# Altium footprint library SMT.PcbLib: 325 footprints (part 18 of 21)
Each footprint in its own frame and in the unit in brackets; x right, y up, seen from the top. Pads: shape width x height; smd on the part's side, far side on the other; paste and mask are expansions set on the pad; w line width, h text height; cw(c..) or ccw(c..) is an arc to the next point about the centre after c.
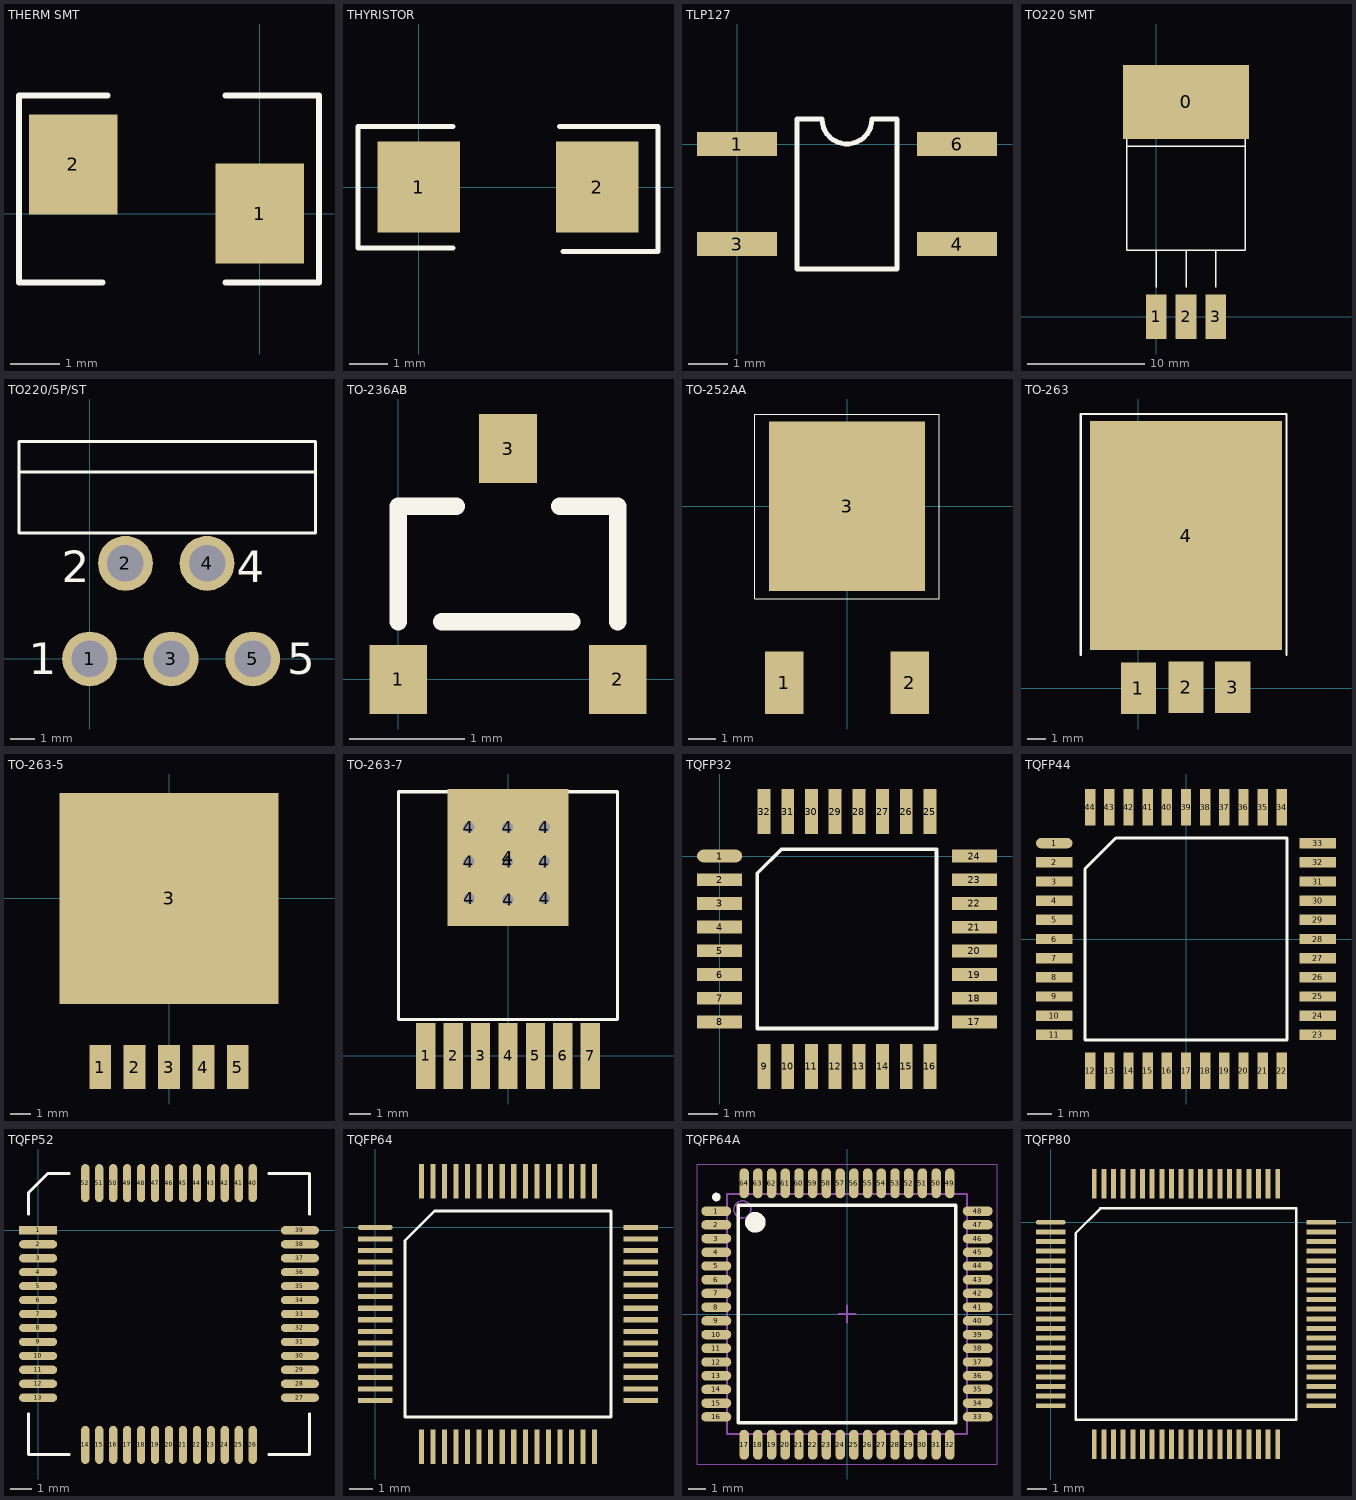
[diagram p17: the footprints below, top view; thin cyan lines are the x and y axes]

## THERM SMT [mm]
pads (2):
  rect 1.8x2.032 smd: 1(0,0) 2(-3.8,1)
TopOverlay:
  lines w0.127: -3.2,-1.4 -4.9,-1.4 -4.9,2.4 -3.1,2.4 ; -0.7,-1.4 1.2,-1.4 1.2,2.4 -0.7,2.4

## THYRISTOR [mm]
pads (2):
  rect 2.16x2.4 smd: 1(0,0) 2(4.7,0)
TopOverlay:
  lines w0.127: 0.9,-1.6 -1.6,-1.6 -1.6,1.6 0.9,1.6 ; 3.7,1.6 6.3,1.6 6.3,-1.7 3.8,-1.7

## TLP127 [mil]
pads (4):
  rect 80x24 smd: 1(0,0) 3(0,-100) 4(220,-100) 6(220,0)
TopOverlay:
  lines w5: 60,-125 60,25 85,25 ccw(c110,25) 135,25 160,25 160,-125 60,-125

## TO220 SMT [mil]
pads (4):
  rect 425x250 smd: 0(100,725)
  rect 70x150 smd: 1(0,0) 2(100,0) 3(200,0)
TopOverlay:
  lines w5: -100,575 300,575 ; 0,100 0,225 ; 100,100 100,225 ; 200,100 200,225 ; -100,225 -100,825 300,825 300,225 -100,225

## TO220/5P/ST [mil]
pads (5):
  round 90 hole 60: 1(0,0) 2(59,157) 3(134,0) 4(193,157) 5(268,0)
TopOverlay:
  lines w5: -116,307 371,307 ; -116,207 -116,357 371,357 371,207 -116,207
  text "2" at -46,126 h52
  text "4" at 242,126 h52
  text "5" at 325,-25 h52
  text "1" at -100,-25 h52

## TO-236AB [mm]
height 1.1
pads (3):
  rect 0.5x0.6 smd: 1(0,0) 2(1.9,0) 3(0.95,2)
TopOverlay:
  lines w0.152: 0,0.5 0,1.5 0.5,1.5 ; 0.375,0.5 1.5,0.5 ; 1.4,1.5 1.9,1.5 1.9,0.5

## TO-252AA [mil] "DPAK (TO-252)"
height 2.38
pads (3):
  rect 55x90 smd: 1(-90,-253.35) 2(90,-253.35)
  rect 224.02x243.31 smd: 3(0,0)
TopOverlay:
  lines w1: -132.48,-132.48 -132.48,132.48 132.48,132.48 132.48,-132.48 -132.48,-132.48
3D body: height 22.83, standoff 0, extent 76.65,-280.51 106.18,-191.93
3D body: height 47.24, standoff 0, extent 76.65,-191.93 106.18,-177.17
3D body: height 47.24, standoff 22.83, extent 76.65,-191.93 106.18,-122.05
3D body: height 22.83, standoff 0, extent -118.11,86.61 118.11,132.87
3D body: height 47.24, standoff 22.83, extent -103.35,-191.93 -73.82,-122.05
3D body: height 47.24, standoff 0, extent -103.35,-191.93 -73.82,-177.17
3D body: height 22.83, standoff 0, extent -103.35,-280.51 -73.82,-191.93
3D body: height 94.09, standoff 0, extent -131.89,-122.05 131.89,86.61

## TO-263 [mil]
pads (4):
  rect 75x110 smd: 1(0,0) 2(101.69,1.89) 3(201.69,1.89)
  rect 410x490 smd: 4(101.69,326.89)
TopOverlay:
  lines w5: -123.31,71.89 -123.31,586.89 316.69,586.89 316.69,71.89

## TO-263-5 [mm] "5-LEAD TP-263 PACKAGE"
height 4.65
pads (6):
  rect 1.07x2.16 smd: 1(-3.4,-8.325) 2(-1.7,-8.325) 3(0,-8.325) 4(1.7,-8.325) 5(3.4,-8.325)
  rect 10.8x10.41 smd: 3(0,0)

## TO-263-7 [mm]
height 0.051
pads (17):
  rect 0.89x3.06 smd: 1(-3.81,0) 2(-2.54,0) 3(-1.27,0) 4(0,0) 5(1.27,0) 6(2.54,0) 7(3.81,0)
  round 1 hole 0.5: 4(-1.813,9.01) 4(-1.813,10.6) 4(-1.8,7.305) 4(-0.012,9.01) 4(-0.012,10.6) 4(0,7.25) 4(1.687,9.01) 4(1.687,10.6) 4(1.7,7.305)
  rect 5.59x6.35 smd: 4(0,9.2)
TopOverlay:
  lines w0.152: -5.08,1.695 -5.08,12.245 5.08,12.245 5.08,1.695 -5.08,1.695
3D body: height 2, standoff 0, extent -5.08,1.7 5.08,12.25
3D body: height 0.2, standoff 0, extent -4.135,-0.625 -3.485,0.625
3D body: height 0.8, standoff 0, extent -4.135,0.625 -3.485,0.875
3D body: height 0.8, standoff 0.6, extent -4.135,0.875 -3.485,1.7
3D body: height 0.8, standoff 0.6, extent -2.865,0.875 -2.215,1.7
3D body: height 0.8, standoff 0, extent -2.865,0.625 -2.215,0.875
3D body: height 0.2, standoff 0, extent -2.865,-0.625 -2.215,0.625
3D body: height 0.8, standoff 0.6, extent -1.595,0.875 -0.945,1.7
3D body: height 0.8, standoff 0, extent -1.595,0.625 -0.945,0.875
3D body: height 0.2, standoff 0, extent -1.595,-0.625 -0.945,0.625
3D body: height 0.8, standoff 0.6, extent -0.325,0.875 0.325,1.7
3D body: height 0.8, standoff 0, extent -0.325,0.625 0.325,0.875
3D body: height 0.2, standoff 0, extent -0.325,-0.625 0.325,0.625
3D body: height 0.8, standoff 0.6, extent 0.945,0.875 1.595,1.7
3D body: height 0.8, standoff 0, extent 0.945,0.625 1.595,0.875
3D body: height 0.2, standoff 0, extent 0.945,-0.625 1.595,0.625
3D body: height 0.8, standoff 0.6, extent 2.215,0.875 2.865,1.7
3D body: height 0.8, standoff 0, extent 2.215,0.625 2.865,0.875
3D body: height 0.2, standoff 0, extent 2.215,-0.625 2.865,0.625
3D body: height 0.8, standoff 0.6, extent 3.485,0.875 4.135,1.7
3D body: height 0.8, standoff 0, extent 3.485,0.625 4.135,0.875
3D body: height 0.2, standoff 0, extent 3.485,-0.625 4.135,0.625

## TQFP32 [mil]
pads (32):
  oval 60x17 smd: 1(0,0)
  rect 60x17 smd: 2(0,-31.5) 3(0,-62.99) 4(0,-94.49) 5(0,-125.98) 6(0,-157.48) 7(0,-188.98) 8(0,-220.47) 17(338.58,-220.54) 18(338.58,-189.04) 19(338.58,-157.54) 20(338.58,-126.05) 21(338.58,-94.55) 22(338.58,-63.05) 23(338.58,-31.56) 24(338.58,-0.06)
  rect 17x60 smd: 9(59.05,-279.53) 10(90.55,-279.53) 11(122.05,-279.53) 12(153.54,-279.53) 13(185.04,-279.53) 14(216.54,-279.53) 15(248.03,-279.53) 16(279.53,-279.53) 25(279.53,58.99) 26(248.03,58.99) 27(216.54,58.99) 28(185.04,58.99) 29(153.54,58.99) 30(122.05,58.99) 31(90.55,58.99) 32(59.05,58.99)
TopOverlay:
  lines w5: 50.07,-229.01 288.07,-229.01 288.07,8.99 82.07,8.99 50.07,-23.01 50.07,-229.01

## TQFP44 [mil]
pads (44):
  oval 60x17 smd: 1(-216.54,157.48)
  rect 60x17 smd: 2(-216.54,125.98) 3(-216.54,94.49) 4(-216.54,62.99) 5(-216.54,31.5) 6(-216.54,0) 7(-216.54,-31.5) 8(-216.54,-62.99) 9(-216.54,-94.49) 10(-216.54,-125.98) 11(-216.54,-157.48) 23(216.54,-157.48) 24(216.54,-125.98) 25(216.54,-94.49) 26(216.54,-62.99) 27(216.54,-31.5) 28(216.54,0) 29(216.54,31.5) 30(216.54,62.99) 31(216.54,94.49) 32(216.54,125.98) 33(216.54,157.48)
  rect 17x60 smd: 12(-157.48,-216.54) 13(-125.98,-216.54) 14(-94.49,-216.54) 15(-62.99,-216.54) 16(-31.5,-216.54) 17(0,-216.54) 18(31.5,-216.54) 19(62.99,-216.54) 20(94.49,-216.54) 21(125.98,-216.54) 22(157.48,-216.54) 34(157.48,216.54) 35(125.98,216.54) 36(94.49,216.54) 37(62.99,216.54) 38(31.5,216.54) 39(0,216.54) 40(-31.5,216.54) 41(-62.99,216.54) 42(-94.49,216.54) 43(-125.98,216.54) 44(-157.48,216.54)
TopOverlay:
  lines w5: -165.95,-165.95 -165.95,115.35 -115.35,165.95 165.95,165.95 165.95,-165.95 -165.95,-165.95

## TQFP52 [mil]
pads (52):
  rect 70x15 smd: 1(0,0)
  oval 70x15 smd: 2(0,-25.59) 3(0,-51.18) 4(0,-76.77) 5(0,-102.36) 6(0,-127.95) 7(0,-153.54) 8(0,-179.13) 9(0,-204.72) 10(0,-230.31) 11(0,-255.91) 12(0,-281.5) 13(0,-307.09) 27(480.32,-307.09) 28(480.32,-281.5) 29(480.32,-255.91) 30(480.32,-230.31) 31(480.32,-204.72) 32(480.32,-179.13) 33(480.32,-153.54) 34(480.32,-127.95) 35(480.32,-102.36) 36(480.32,-76.77) 37(480.32,-51.18) 38(480.32,-25.59) 39(480.32,0)
  oval 15x70 smd: 14(86.61,-393.7) 15(112.2,-393.7) 16(137.79,-393.7) 17(163.39,-393.7) 18(188.98,-393.7) 19(214.57,-393.7) 20(240.16,-393.7) 21(265.75,-393.7) 22(291.34,-393.7) 23(316.93,-393.7) 24(342.52,-393.7) 25(368.11,-393.7) 26(393.7,-393.7) 40(393.7,86.61) 41(368.11,86.61) 42(342.52,86.61) 43(316.93,86.61) 44(291.34,86.61) 45(265.75,86.61) 46(240.16,86.61) 47(214.57,86.61) 48(188.98,86.61) 49(163.39,86.61) 50(137.79,86.61) 51(112.2,86.61) 52(86.61,86.61)
TopOverlay:
  lines w5: -17.72,-336.62 -17.72,-411.42 57.09,-411.42 ; -17.72,29.53 -17.72,68.9 17.72,104.33 57.09,104.33 ; 423.23,-411.42 498.03,-411.42 498.03,-336.62 ; 423.23,104.33 498.03,104.33 498.03,29.53

## TQFP64 [mm]
pads (64):
  oval 1.5x0.22 smd: 1(0,0)
  rect 1.5x0.22 smd: 2(0,-0.5) 3(0,-1) 4(0,-1.5) 5(0,-2) 6(0,-2.5) 7(0,-3) 8(0,-3.5) 9(0,-4) 10(0,-4.5) 11(0,-5) 12(0,-5.5) 13(0,-6) 14(0,-6.5) 15(0,-7) 16(0,-7.5) 33(11.5,-7.5) 34(11.5,-7) 35(11.5,-6.5) 36(11.5,-6) 37(11.5,-5.5) 38(11.5,-5) 39(11.5,-4.5) 40(11.5,-4) 41(11.5,-3.5) 42(11.5,-3) 43(11.5,-2.5) 44(11.5,-2) 45(11.5,-1.5) 46(11.5,-1) 47(11.5,-0.5) 48(11.5,0)
  rect 0.22x1.5 smd: 17(2,-9.5) 18(2.5,-9.5) 19(3,-9.5) 20(3.5,-9.5) 21(4,-9.5) 22(4.5,-9.5) 23(5,-9.5) 24(5.5,-9.5) 25(6,-9.5) 26(6.5,-9.5) 27(7,-9.5) 28(7.5,-9.5) 29(8,-9.5) 30(8.5,-9.5) 31(9,-9.5) 32(9.5,-9.5) 49(9.5,2) 50(9,2) 51(8.5,2) 52(8,2) 53(7.5,2) 54(7,2) 55(6.5,2) 56(6,2) 57(5.5,2) 58(5,2) 59(4.5,2) 60(4,2) 61(3.5,2) 62(3,2) 63(2.5,2) 64(2,2)
TopOverlay:
  lines w0.127: 1.285,-8.215 10.215,-8.215 10.215,0.715 2.57,0.715 1.285,-0.57 1.285,-8.215

## TQFP64A [mm] "TQFP, 64-Leads, Body 14.00x14.00mm, Pitch 0.80mm, IPC Medium Density"
height 1.2
pads (64):
  oval 1.75x0.55 smd: 1(-7.625,6) 2(-7.625,5.2) 3(-7.625,4.4) 4(-7.625,3.6) 5(-7.625,2.8) 6(-7.625,2) 7(-7.625,1.2) 8(-7.625,0.4) 9(-7.625,-0.4) 10(-7.625,-1.2) 11(-7.625,-2) 12(-7.625,-2.8) 13(-7.625,-3.6) 14(-7.625,-4.4) 15(-7.625,-5.2) 16(-7.625,-6) 33(7.625,-6) 34(7.625,-5.2) 35(7.625,-4.4) 36(7.625,-3.6) 37(7.625,-2.8) 38(7.625,-2) 39(7.625,-1.2) 40(7.625,-0.4) 41(7.625,0.4) 42(7.625,1.2) 43(7.625,2) 44(7.625,2.8) 45(7.625,3.6) 46(7.625,4.4) 47(7.625,5.2) 48(7.625,6)
  oval 0.55x1.75 smd: 17(-6,-7.625) 18(-5.2,-7.625) 19(-4.4,-7.625) 20(-3.6,-7.625) 21(-2.8,-7.625) 22(-2,-7.625) 23(-1.2,-7.625) 24(-0.4,-7.625) 25(0.4,-7.625) 26(1.2,-7.625) 27(2,-7.625) 28(2.8,-7.625) 29(3.6,-7.625) 30(4.4,-7.625) 31(5.2,-7.625) 32(6,-7.625) 49(6,7.625) 50(5.2,7.625) 51(4.4,7.625) 52(3.6,7.625) 53(2.8,7.625) 54(2,7.625) 55(1.2,7.625) 56(0.4,7.625) 57(-0.4,7.625) 58(-1.2,7.625) 59(-2,7.625) 60(-2.8,7.625) 61(-3.6,7.625) 62(-4.4,7.625) 63(-5.2,7.625) 64(-6,7.625)
TopOverlay:
  circle w0.25: c-7.625,6.825 r0.125
  circle w0.6: c-5.35,5.35 r0.3
  lines w0.2: -6.35,-6.35 -6.35,6.35 6.35,6.35 6.35,-6.35 -6.35,-6.35
Mechanical13:
  circle w0.1: c-6.1,6.1 r0.5
  lines w0.1: -7,-7 -7,7 7,7 7,-7 -7,-7
Mechanical15:
  lines w0.05: -8.75,-8.75 -8.75,8.75 8.75,8.75 8.75,-8.75 -8.75,-8.75
  lines w0.1: -0.5,0 0.5,0 ; 0,-0.5 0,0.5
3D body: height 1.2, standoff 0.1, extent -7,-7 7,7

## TQFP80 [mil]
pads (80):
  oval 60x10 smd: 1(0,0)
  rect 60x10 smd: 2(0,-19.68) 3(0,-39.37) 4(0,-59.05) 5(0,-78.74) 6(0,-98.42) 7(0,-118.11) 8(0,-137.79) 9(0,-157.48) 10(0,-177.16) 11(0,-196.85) 12(0,-216.53) 13(0,-236.22) 14(0,-255.91) 15(0,-275.59) 16(0,-295.27) 17(0,-314.96) 18(0,-334.64) 19(0,-354.33) 20(0,-374.01) 41(551.18,-374.01) 42(551.18,-354.33) 43(551.18,-334.64) 44(551.18,-314.96) 45(551.18,-295.27) 46(551.18,-275.59) 47(551.18,-255.91) 48(551.18,-236.22) 49(551.18,-216.53) 50(551.18,-196.85) 51(551.18,-177.16) 52(551.18,-157.48) 53(551.18,-137.79) 54(551.18,-118.11) 55(551.18,-98.42) 56(551.18,-78.74) 57(551.18,-59.05) 58(551.18,-39.37) 59(551.18,-19.68) 60(551.18,0)
  rect 10x60 smd: 21(88.58,-452.75) 22(108.27,-452.75) 23(127.95,-452.75) 24(147.64,-452.75) 25(167.32,-452.75) 26(187.01,-452.75) 27(206.69,-452.75) 28(226.38,-452.75) 29(246.06,-452.75) 30(265.75,-452.75) 31(285.43,-452.75) 32(305.12,-452.75) 33(324.8,-452.75) 34(344.49,-452.75) 35(364.17,-452.75) 36(383.86,-452.75) 37(403.54,-452.75) 38(423.23,-452.75) 39(442.91,-452.75) 40(462.6,-452.75) 61(462.6,78.74) 62(442.91,78.74) 63(423.23,78.74) 64(403.54,78.74) 65(383.86,78.74) 66(364.17,78.74) 67(344.49,78.74) 68(324.8,78.74) 69(305.12,78.74) 70(285.43,78.74) 71(265.75,78.74) 72(246.06,78.74) 73(226.38,78.74) 74(206.69,78.74) 75(187.01,78.74) 76(167.32,78.74) 77(147.64,78.74) 78(127.95,78.74) 79(108.27,78.74) 80(88.58,78.74)
TopOverlay:
  lines w5: 50.59,-402.17 50.59,-22.44 101.18,28.15 500.59,28.15 500.59,-402.17 50.59,-402.17